# Altium footprint library PowerProducts.PCBLIB: 166 footprints (part 3 of 11)
Each footprint in its own frame and in the unit in brackets; x right, y up, seen from the top. Pads: shape width x height; smd on the part's side, far side on the other; paste and mask are expansions set on the pad; w line width, h text height; cw(c..) or ccw(c..) is an arc to the next point about the centre after c.
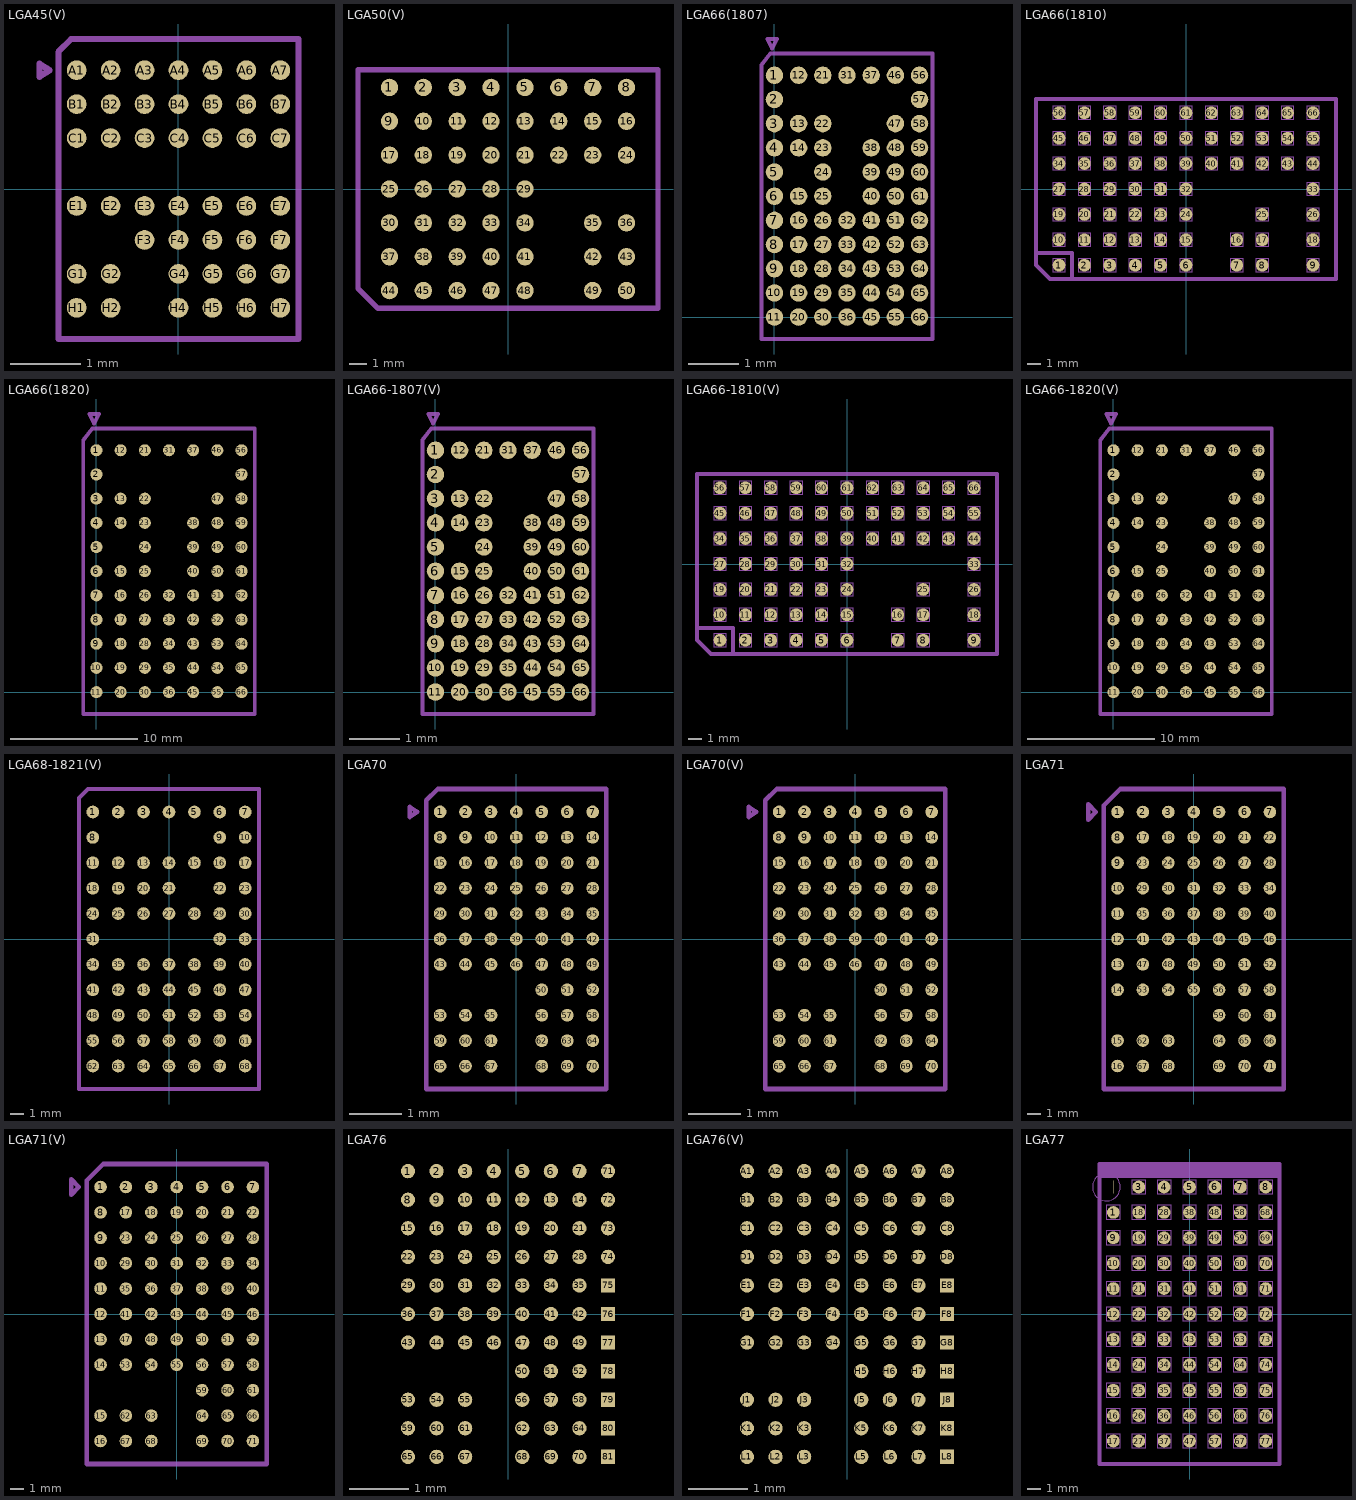
[diagram p2: the footprints below, top view; thin cyan lines are the x and y axes]

## LGA45(V) [mil]
pads (45):
  rrect100% 11.05x11.05 smd: A1(-57.15,66.68) A2(-38.1,66.68) A3(-19.05,66.68) A4(0,66.68) A5(19.05,66.68) A6(38.1,66.68) A7(57.15,66.68) B1(-57.15,47.63) B2(-38.1,47.63) B3(-19.05,47.63) B4(0,47.63) B5(19.05,47.63) B6(38.1,47.63) B7(57.15,47.63) C1(-57.15,28.58) C2(-38.1,28.58) C3(-19.05,28.58) C4(0,28.58) C5(19.05,28.58) C6(38.1,28.58) C7(57.15,28.58) E1(-57.15,-9.53) E2(-38.1,-9.53) E3(-19.05,-9.53) E4(0,-9.53) E5(19.05,-9.53) E6(38.1,-9.53) E7(57.15,-9.53) F3(-19.05,-28.58) F4(0,-28.58) F5(19.05,-28.58) F6(38.1,-28.58) F7(57.15,-28.58) G1(-57.15,-47.63) G2(-38.1,-47.63) G4(0,-47.63) G5(19.05,-47.63) G6(38.1,-47.63) G7(57.15,-47.63) H1(-57.15,-66.68) H2(-38.1,-66.68) H4(0,-66.68) H5(19.05,-66.68) H6(38.1,-66.68) H7(57.15,-66.68)
Mechanical 2:
  lines w3.43: -78.1,62.87 -72.39,66.68 -78.1,70.49 -78.1,62.87 ; -67.44,-84.2 67.44,-84.2 67.44,84.2 -60.2,84.2 -67.44,76.96 -67.44,-84.2

## LGA50(V) [mil]
pads (50):
  rrect100% 38.39x38.39 smd: 1(-262.5,225) 2(-187.5,225) 3(-112.5,225) 4(-37.5,225) 5(37.5,225) 6(112.5,225) 7(187.5,225) 8(262.5,225) 9(-262.5,150) 10(-187.5,150) 11(-112.5,150) 12(-37.5,150) 13(37.5,150) 14(112.5,150) 15(187.5,150) 16(262.5,150) 17(-262.5,75) 18(-187.5,75) 19(-112.5,75) 20(-37.5,75) 21(37.5,75) 22(112.5,75) 23(187.5,75) 24(262.5,75) 25(-262.5,0) 26(-187.5,0) 27(-112.5,0) 28(-37.5,0) 29(37.5,0) 30(-262.5,-75) 31(-187.5,-75) 32(-112.5,-75) 33(-37.5,-75) 34(37.5,-75) 35(187.5,-75) 36(262.5,-75) 37(-262.5,-150) 38(-187.5,-150) 39(-112.5,-150) 40(-37.5,-150) 41(37.5,-150) 42(187.5,-150) 43(262.5,-150) 44(-262.5,-225) 45(-187.5,-225) 46(-112.5,-225) 47(-37.5,-225) 48(37.5,-225) 49(187.5,-225) 50(262.5,-225)
Mechanical 2:
  lines w11.81: -332.19,-219.98 -287.89,-264.27 332.19,-264.27 332.19,264.27 -332.19,264.27 -332.19,-219.98

## LGA66(1807) [mil]
pads (66):
  rrect100% 13.72x13.72 smd: 1(0,190.5) 2(0,171.45) 3(0,152.4) 4(0,133.35) 5(0,114.3) 6(0,95.25) 7(0,76.2) 8(0,57.15) 9(0,38.1) 10(0,19.05) 11(0,0) 12(19.05,190.5) 13(19.05,152.4) 14(19.05,133.35) 15(19.05,95.25) 16(19.05,76.2) 17(19.05,57.15) 18(19.05,38.1) 19(19.05,19.05) 20(19.05,0) 21(38.1,190.5) 22(38.1,152.4) 23(38.1,133.35) 24(38.1,114.3) 25(38.1,95.25) 26(38.1,76.2) 27(38.1,57.15) 28(38.1,38.1) 29(38.1,19.05) 30(38.1,0) 31(57.15,190.5) 32(57.15,76.2) 33(57.15,57.15) 34(57.15,38.1) 35(57.15,19.05) 36(57.15,0) 37(76.2,190.5) 38(76.2,133.35) 39(76.2,114.3) 40(76.2,95.25) 41(76.2,76.2) 42(76.2,57.15) 43(76.2,38.1) 44(76.2,19.05) 45(76.2,0) 46(95.25,190.5) 47(95.25,152.4) 48(95.25,133.35) 49(95.25,114.3) 50(95.25,95.25) 51(95.25,76.2) 52(95.25,57.15) 53(95.25,38.1) 54(95.25,19.05) 55(95.25,0) 56(114.3,190.5) 57(114.3,171.45) 58(114.3,152.4) 59(114.3,133.35) 60(114.3,114.3) 61(114.3,95.25) 62(114.3,76.2) 63(114.3,57.15) 64(114.3,38.1) 65(114.3,19.05) 66(114.3,0)
Mechanical 2:
  lines w3.05: -10.35,-17.25 -10.35,198.5 -2.98,207.75 124.65,207.75 124.65,-17.25 -10.35,-17.25 ; -5.72,219.08 1.91,219.08 -1.91,211.46 -5.72,219.08

## LGA66(1810) [mil]
pads (66):
  rrect100% 37.5x37.5 smd: 1(-375,-225) 2(-300,-225) 3(-225,-225) 4(-150,-225) 5(-75,-225) 6(0,-225) 7(150,-225) 8(225,-225) 9(375,-225) 10(-375,-150) 11(-300,-150) 12(-225,-150) 13(-150,-150) 14(-75,-150) 15(0,-150) 16(150,-150) 17(225,-150) 18(375,-150) 19(-375,-75) 20(-300,-75) 21(-225,-75) 22(-150,-75) 23(-75,-75) 24(0,-75) 25(225,-75) 26(375,-75) 27(-375,0) 28(-300,0) 29(-225,0) 30(-150,0) 31(-75,0) 32(0,0) 33(375,0) 34(-375,75) 35(-300,75) 36(-225,75) 37(-150,75) 38(-75,75) 39(0,75) 40(75,75) 41(150,75) 42(225,75) 43(300,75) 44(375,75) 45(-375,150) 46(-300,150) 47(-225,150) 48(-150,150) 49(-75,150) 50(0,150) 51(75,150) 52(150,150) 53(225,150) 54(300,150) 55(375,150) 56(-375,225) 57(-300,225) 58(-225,225) 59(-150,225) 60(-75,225) 61(0,225) 62(75,225) 63(150,225) 64(225,225) 65(300,225) 66(375,225)
Mechanical 2:
  drawing of 271 lines, arcs and shapes, not listed

## LGA66(1820) [mil]
pads (66):
  rrect100% 37.2x37.2 smd: 1(0,750) 2(0,675) 3(0,600) 4(0,525) 5(0,450) 6(0,375) 7(0,300) 8(0,225) 9(0,150) 10(0,75) 11(0,0) 12(75,750) 13(75,600) 14(75,525) 15(75,375) 16(75,300) 17(75,225) 18(75,150) 19(75,75) 20(75,0) 21(150,750) 22(150,600) 23(150,525) 24(150,450) 25(150,375) 26(150,300) 27(150,225) 28(150,150) 29(150,75) 30(150,0) 31(225,750) 32(225,300) 33(225,225) 34(225,150) 35(225,75) 36(225,0) 37(300,750) 38(300,525) 39(300,450) 40(300,375) 41(300,300) 42(300,225) 43(300,150) 44(300,75) 45(300,0) 46(375,750) 47(375,600) 48(375,525) 49(375,450) 50(375,375) 51(375,300) 52(375,225) 53(375,150) 54(375,75) 55(375,0) 56(450,750) 57(450,675) 58(450,600) 59(450,525) 60(450,450) 61(450,375) 62(450,300) 63(450,225) 64(450,150) 65(450,75) 66(450,0)
Mechanical 2:
  lines w12: -40.75,-67.91 -40.75,781.5 -11.75,817.91 490.75,817.91 490.75,-67.91 -40.75,-67.91 ; -22.5,862.5 7.5,862.5 -7.5,832.5 -22.5,862.5

## LGA66-1807(V) [mil]
pads (66):
  rrect100% 13.72x13.72 smd: 1(0,190.5) 2(0,171.45) 3(0,152.4) 4(0,133.35) 5(0,114.3) 6(0,95.25) 7(0,76.2) 8(0,57.15) 9(0,38.1) 10(0,19.05) 11(0,0) 12(19.05,190.5) 13(19.05,152.4) 14(19.05,133.35) 15(19.05,95.25) 16(19.05,76.2) 17(19.05,57.15) 18(19.05,38.1) 19(19.05,19.05) 20(19.05,0) 21(38.1,190.5) 22(38.1,152.4) 23(38.1,133.35) 24(38.1,114.3) 25(38.1,95.25) 26(38.1,76.2) 27(38.1,57.15) 28(38.1,38.1) 29(38.1,19.05) 30(38.1,0) 31(57.15,190.5) 32(57.15,76.2) 33(57.15,57.15) 34(57.15,38.1) 35(57.15,19.05) 36(57.15,0) 37(76.2,190.5) 38(76.2,133.35) 39(76.2,114.3) 40(76.2,95.25) 41(76.2,76.2) 42(76.2,57.15) 43(76.2,38.1) 44(76.2,19.05) 45(76.2,0) 46(95.25,190.5) 47(95.25,152.4) 48(95.25,133.35) 49(95.25,114.3) 50(95.25,95.25) 51(95.25,76.2) 52(95.25,57.15) 53(95.25,38.1) 54(95.25,19.05) 55(95.25,0) 56(114.3,190.5) 57(114.3,171.45) 58(114.3,152.4) 59(114.3,133.35) 60(114.3,114.3) 61(114.3,95.25) 62(114.3,76.2) 63(114.3,57.15) 64(114.3,38.1) 65(114.3,19.05) 66(114.3,0)
Mechanical 2:
  lines w3.05: -10.35,-17.25 -10.35,198.5 -2.98,207.75 124.65,207.75 124.65,-17.25 -10.35,-17.25 ; -5.72,219.08 1.91,219.08 -1.91,211.46 -5.72,219.08

## LGA66-1810(V) [mil]
pads (66):
  rrect100% 37.5x37.5 smd: 1(-375,-225) 2(-300,-225) 3(-225,-225) 4(-150,-225) 5(-75,-225) 6(0,-225) 7(150,-225) 8(225,-225) 9(375,-225) 10(-375,-150) 11(-300,-150) 12(-225,-150) 13(-150,-150) 14(-75,-150) 15(0,-150) 16(150,-150) 17(225,-150) 18(375,-150) 19(-375,-75) 20(-300,-75) 21(-225,-75) 22(-150,-75) 23(-75,-75) 24(0,-75) 25(225,-75) 26(375,-75) 27(-375,0) 28(-300,0) 29(-225,0) 30(-150,0) 31(-75,0) 32(0,0) 33(375,0) 34(-375,75) 35(-300,75) 36(-225,75) 37(-150,75) 38(-75,75) 39(0,75) 40(75,75) 41(150,75) 42(225,75) 43(300,75) 44(375,75) 45(-375,150) 46(-300,150) 47(-225,150) 48(-150,150) 49(-75,150) 50(0,150) 51(75,150) 52(150,150) 53(225,150) 54(300,150) 55(375,150) 56(-375,225) 57(-300,225) 58(-225,225) 59(-150,225) 60(-75,225) 61(0,225) 62(75,225) 63(150,225) 64(225,225) 65(300,225) 66(375,225)
Mechanical 2:
  drawing of 273 lines, arcs and shapes, not listed

## LGA66-1820(V) [mil]
pads (66):
  rrect100% 37.2x37.2 smd: 1(0,750) 2(0,675) 3(0,600) 4(0,525) 5(0,450) 6(0,375) 7(0,300) 8(0,225) 9(0,150) 10(0,75) 11(0,0) 12(75,750) 13(75,600) 14(75,525) 15(75,375) 16(75,300) 17(75,225) 18(75,150) 19(75,75) 20(75,0) 21(150,750) 22(150,600) 23(150,525) 24(150,450) 25(150,375) 26(150,300) 27(150,225) 28(150,150) 29(150,75) 30(150,0) 31(225,750) 32(225,300) 33(225,225) 34(225,150) 35(225,75) 36(225,0) 37(300,750) 38(300,525) 39(300,450) 40(300,375) 41(300,300) 42(300,225) 43(300,150) 44(300,75) 45(300,0) 46(375,750) 47(375,600) 48(375,525) 49(375,450) 50(375,375) 51(375,300) 52(375,225) 53(375,150) 54(375,75) 55(375,0) 56(450,750) 57(450,675) 58(450,600) 59(450,525) 60(450,450) 61(450,375) 62(450,300) 63(450,225) 64(450,150) 65(450,75) 66(450,0)
Mechanical 2:
  lines w12: -40.75,-67.91 -40.75,781.5 -11.75,817.91 490.75,817.91 490.75,-67.91 -40.75,-67.91 ; -22.5,862.5 7.5,862.5 -7.5,832.5 -22.5,862.5

## LGA68-1821(V) [mil]
pads (68):
  rrect100% 37.5x37.5 smd: 1(-225,375) 2(-150,375) 3(-75,375) 4(0,375) 5(75,375) 6(150,375) 7(225,375) 8(-225,300) 9(150,300) 10(225,300) 11(-225,225) 12(-150,225) 13(-75,225) 14(0,225) 15(75,225) 16(150,225) 17(225,225) 18(-225,150) 19(-150,150) 20(-75,150) 21(0,150) 22(150,150) 23(225,150) 24(-225,75) 25(-150,75) 26(-75,75) 27(0,75) 28(75,75) 29(150,75) 30(225,75) 31(-225,0) 32(150,0) 33(225,0) 34(-225,-75) 35(-150,-75) 36(-75,-75) 37(0,-75) 38(75,-75) 39(150,-75) 40(225,-75) 41(-225,-150) 42(-150,-150) 43(-75,-150) 44(0,-150) 45(75,-150) 46(150,-150) 47(225,-150) 48(-225,-225) 49(-150,-225) 50(-75,-225) 51(0,-225) 52(75,-225) 53(150,-225) 54(225,-225) 55(-225,-300) 56(-150,-300) 57(-75,-300) 58(0,-300) 59(75,-300) 60(150,-300) 61(225,-300) 62(-225,-375) 63(-150,-375) 64(-75,-375) 65(0,-375) 66(75,-375) 67(150,-375) 68(225,-375)
Mechanical 2:
  lines w11.81: -265.75,-442.91 -265.75,416.66 -239.5,442.91 265.75,442.91 265.75,-442.91 -265.75,-442.91

## LGA70 [mil]
pads (70):
  rrect100% 9.53x9.53 smd: 1(-57.15,95.25) 2(-38.1,95.25) 3(-19.05,95.25) 4(0,95.25) 5(19.05,95.25) 6(38.1,95.25) 7(57.15,95.25) 8(-57.15,76.2) 9(-38.1,76.2) 10(-19.05,76.2) 11(0,76.2) 12(19.05,76.2) 13(38.1,76.2) 14(57.15,76.2) 15(-57.15,57.15) 16(-38.1,57.15) 17(-19.05,57.15) 18(0,57.15) 19(19.05,57.15) 20(38.1,57.15) 21(57.15,57.15) 22(-57.15,38.1) 23(-38.1,38.1) 24(-19.05,38.1) 25(0,38.1) 26(19.05,38.1) 27(38.1,38.1) 28(57.15,38.1) 29(-57.15,19.05) 30(-38.1,19.05) 31(-19.05,19.05) 32(0,19.05) 33(19.05,19.05) 34(38.1,19.05) 35(57.15,19.05) 36(-57.15,0) 37(-38.1,0) 38(-19.05,0) 39(0,0) 40(19.05,0) 41(38.1,0) 42(57.15,0) 43(-57.15,-19.05) 44(-38.1,-19.05) 45(-19.05,-19.05) 46(0,-19.05) 47(19.05,-19.05) 48(38.1,-19.05) 49(57.15,-19.05) 50(19.05,-38.1) 51(38.1,-38.1) 52(57.15,-38.1) 53(-57.15,-57.15) 54(-38.1,-57.15) 55(-19.05,-57.15) 56(19.05,-57.15) 57(38.1,-57.15) 58(57.15,-57.15) 59(-57.15,-76.2) 60(-38.1,-76.2) 61(-19.05,-76.2) 62(19.05,-76.2) 63(38.1,-76.2) 64(57.15,-76.2) 65(-57.15,-95.25) 66(-38.1,-95.25) 67(-19.05,-95.25) 68(19.05,-95.25) 69(38.1,-95.25) 70(57.15,-95.25)
Mechanical 2:
  lines w3.43: -80.01,91.44 -74.3,95.25 -80.01,99.06 -80.01,91.44 ; -67.44,-112.4 67.44,-112.4 67.44,112.4 -59.06,112.4 -67.44,104.01 -67.44,-112.4

## LGA70(V) [mil]
pads (70):
  rrect100% 9.53x9.53 smd: 1(-57.15,95.25) 2(-38.1,95.25) 3(-19.05,95.25) 4(0,95.25) 5(19.05,95.25) 6(38.1,95.25) 7(57.15,95.25) 8(-57.15,76.2) 9(-38.1,76.2) 10(-19.05,76.2) 11(0,76.2) 12(19.05,76.2) 13(38.1,76.2) 14(57.15,76.2) 15(-57.15,57.15) 16(-38.1,57.15) 17(-19.05,57.15) 18(0,57.15) 19(19.05,57.15) 20(38.1,57.15) 21(57.15,57.15) 22(-57.15,38.1) 23(-38.1,38.1) 24(-19.05,38.1) 25(0,38.1) 26(19.05,38.1) 27(38.1,38.1) 28(57.15,38.1) 29(-57.15,19.05) 30(-38.1,19.05) 31(-19.05,19.05) 32(0,19.05) 33(19.05,19.05) 34(38.1,19.05) 35(57.15,19.05) 36(-57.15,0) 37(-38.1,0) 38(-19.05,0) 39(0,0) 40(19.05,0) 41(38.1,0) 42(57.15,0) 43(-57.15,-19.05) 44(-38.1,-19.05) 45(-19.05,-19.05) 46(0,-19.05) 47(19.05,-19.05) 48(38.1,-19.05) 49(57.15,-19.05) 50(19.05,-38.1) 51(38.1,-38.1) 52(57.15,-38.1) 53(-57.15,-57.15) 54(-38.1,-57.15) 55(-19.05,-57.15) 56(19.05,-57.15) 57(38.1,-57.15) 58(57.15,-57.15) 59(-57.15,-76.2) 60(-38.1,-76.2) 61(-19.05,-76.2) 62(19.05,-76.2) 63(38.1,-76.2) 64(57.15,-76.2) 65(-57.15,-95.25) 66(-38.1,-95.25) 67(-19.05,-95.25) 68(19.05,-95.25) 69(38.1,-95.25) 70(57.15,-95.25)
Mechanical 2:
  lines w3.43: -80.01,91.44 -74.3,95.25 -80.01,99.06 -80.01,91.44 ; -67.44,-112.4 67.44,-112.4 67.44,112.4 -59.06,112.4 -67.44,104.01 -67.44,-112.4

## LGA71 [mil]
pads (71):
  rrect100% 37.2x37.2 smd: 1(-225,375) 2(-150,375) 3(-75,375) 4(0,375) 5(75,375) 6(150,375) 7(225,375) 8(-225,300) 9(-225,225) 10(-225,150) 11(-225,75) 12(-225,0) 13(-225,-75) 14(-225,-150) 15(-225,-300) 16(-225,-375) 17(-150,300) 18(-75,300) 19(0,300) 20(75,300) 21(150,300) 22(225,300) 23(-150,225) 24(-75,225) 25(0,225) 26(75,225) 27(150,225) 28(225,225) 29(-150,150) 30(-75,150) 31(0,150) 32(75,150) 33(150,150) 34(225,150) 35(-150,75) 36(-75,75) 37(0,75) 38(75,75) 39(150,75) 40(225,75) 41(-150,0) 42(-75,0) 43(0,0) 44(75,0) 45(150,0) 46(225,0) 47(-150,-75) 48(-75,-75) 49(0,-75) 50(75,-75) 51(150,-75) 52(225,-75) 53(-150,-150) 54(-75,-150) 55(0,-150) 56(75,-150) 57(150,-150) 58(225,-150) 59(75,-225) 60(150,-225) 61(225,-225) 62(-150,-300) 63(-75,-300) 64(75,-300) 65(150,-300) 66(225,-300) 67(-150,-375) 68(-75,-375) 69(75,-375) 70(150,-375) 71(225,-375)
Mechanical 2:
  lines w13.5: -311.25,352.5 -311.25,375 -311.25,397.5 -288.75,375 -311.25,352.5 ; -265.75,-442.91 265.75,-442.91 265.75,442.91 -217.09,442.91 -265.75,394.25 -265.75,-442.91

## LGA71(V) [mil]
pads (71):
  rrect100% 37.2x37.2 smd: 1(-225,375) 2(-150,375) 3(-75,375) 4(0,375) 5(75,375) 6(150,375) 7(225,375) 8(-225,300) 9(-225,225) 10(-225,150) 11(-225,75) 12(-225,0) 13(-225,-75) 14(-225,-150) 15(-225,-300) 16(-225,-375) 17(-150,300) 18(-75,300) 19(0,300) 20(75,300) 21(150,300) 22(225,300) 23(-150,225) 24(-75,225) 25(0,225) 26(75,225) 27(150,225) 28(225,225) 29(-150,150) 30(-75,150) 31(0,150) 32(75,150) 33(150,150) 34(225,150) 35(-150,75) 36(-75,75) 37(0,75) 38(75,75) 39(150,75) 40(225,75) 41(-150,0) 42(-75,0) 43(0,0) 44(75,0) 45(150,0) 46(225,0) 47(-150,-75) 48(-75,-75) 49(0,-75) 50(75,-75) 51(150,-75) 52(225,-75) 53(-150,-150) 54(-75,-150) 55(0,-150) 56(75,-150) 57(150,-150) 58(225,-150) 59(75,-225) 60(150,-225) 61(225,-225) 62(-150,-300) 63(-75,-300) 64(75,-300) 65(150,-300) 66(225,-300) 67(-150,-375) 68(-75,-375) 69(75,-375) 70(150,-375) 71(225,-375)
Mechanical 2:
  lines w13.5: -311.25,352.5 -288.75,375 -311.25,397.5 -311.25,352.5 ; -265.75,-442.91 265.75,-442.91 265.75,442.91 -217.09,442.91 -265.75,394.25 -265.75,-442.91

## LGA76 [mil]
pads (81):
  rrect100% 9.53x9.53 smd: 1(-66.68,95.25) 2(-47.63,95.25) 3(-28.58,95.25) 4(-9.53,95.25) 5(9.53,95.25) 6(28.58,95.25) 7(47.63,95.25) 8(-66.68,76.2) 9(-47.63,76.2) 10(-28.58,76.2) 11(-9.53,76.2) 12(9.53,76.2) 13(28.58,76.2) 14(47.63,76.2) 15(-66.68,57.15) 16(-47.63,57.15) 17(-28.58,57.15) 18(-9.53,57.15) 19(9.53,57.15) 20(28.58,57.15) 21(47.63,57.15) 22(-66.68,38.1) 23(-47.63,38.1) 24(-28.58,38.1) 25(-9.53,38.1) 26(9.53,38.1) 27(28.58,38.1) 28(47.63,38.1) 29(-66.68,19.05) 30(-47.63,19.05) 31(-28.58,19.05) 32(-9.53,19.05) 33(9.53,19.05) 34(28.58,19.05) 35(47.63,19.05) 36(-66.68,0) 37(-47.63,0) 38(-28.58,0) 39(-9.53,0) 40(9.53,0) 41(28.58,0) 42(47.63,0) 43(-66.68,-19.05) 44(-47.63,-19.05) 45(-28.58,-19.05) 46(-9.53,-19.05) 47(9.53,-19.05) 48(28.58,-19.05) 49(47.63,-19.05) 50(9.53,-38.1) 51(28.58,-38.1) 52(47.63,-38.1) 53(-66.68,-57.15) 54(-47.63,-57.15) 55(-28.58,-57.15) 56(9.53,-57.15) 57(28.58,-57.15) 58(47.63,-57.15) 59(-66.68,-76.2) 60(-47.63,-76.2) 61(-28.58,-76.2) 62(9.53,-76.2) 63(28.58,-76.2) 64(47.63,-76.2) 65(-66.68,-95.25) 66(-47.63,-95.25) 67(-28.58,-95.25) 68(9.53,-95.25) 69(28.58,-95.25) 70(47.63,-95.25) 71(66.68,95.25) 72(66.68,76.2) 73(66.68,57.15) 74(66.68,38.1)
  rect 9.53x9.53 smd: 75(66.68,19.05) 76(66.68,0) 77(66.68,-19.05) 78(66.68,-38.1) 79(66.68,-57.15) 80(66.68,-76.2) 81(66.68,-95.25)

## LGA76(V) [mil]
pads (81):
  rrect100% 9.53x9.53 smd: A1(-66.68,95.25) A2(-47.63,95.25) A3(-28.58,95.25) A4(-9.53,95.25) A5(9.53,95.25) A6(28.58,95.25) A7(47.63,95.25) A8(66.68,95.25) B1(-66.68,76.2) B2(-47.63,76.2) B3(-28.58,76.2) B4(-9.53,76.2) B5(9.53,76.2) B6(28.58,76.2) B7(47.63,76.2) B8(66.68,76.2) C1(-66.68,57.15) C2(-47.63,57.15) C3(-28.58,57.15) C4(-9.53,57.15) C5(9.53,57.15) C6(28.58,57.15) C7(47.63,57.15) C8(66.68,57.15) D1(-66.68,38.1) D2(-47.63,38.1) D3(-28.58,38.1) D4(-9.53,38.1) D5(9.53,38.1) D6(28.58,38.1) D7(47.63,38.1) D8(66.68,38.1) E1(-66.68,19.05) E2(-47.63,19.05) E3(-28.58,19.05) E4(-9.53,19.05) E5(9.53,19.05) E6(28.58,19.05) E7(47.63,19.05) F1(-66.68,0) F2(-47.63,0) F3(-28.58,0) F4(-9.53,0) F5(9.53,0) F6(28.58,0) F7(47.63,0) G1(-66.68,-19.05) G2(-47.63,-19.05) G3(-28.58,-19.05) G4(-9.53,-19.05) G5(9.53,-19.05) G6(28.58,-19.05) G7(47.63,-19.05) H5(9.53,-38.1) H6(28.58,-38.1) H7(47.63,-38.1) J1(-66.68,-57.15) J2(-47.63,-57.15) J3(-28.58,-57.15) J5(9.53,-57.15) J6(28.58,-57.15) J7(47.63,-57.15) K1(-66.68,-76.2) K2(-47.63,-76.2) K3(-28.58,-76.2) K5(9.53,-76.2) K6(28.58,-76.2) K7(47.63,-76.2) L1(-66.68,-95.25) L2(-47.63,-95.25) L3(-28.58,-95.25) L5(9.53,-95.25) L6(28.58,-95.25) L7(47.63,-95.25)
  rect 9.53x9.53 smd: E8(66.68,19.05) F8(66.68,0) G8(66.68,-19.05) H8(66.68,-38.1) J8(66.68,-57.15) K8(66.68,-76.2) L8(66.68,-95.25)

## LGA77 [mil]
pads (77):
  rrect100% 37.5x37.5 smd: 1(-225,300) 3(-150,375) 4(-75,375) 5(0,375) 6(75,375) 7(150,375) 8(225,375) 9(-225,225) 10(-225,150) 11(-225,75) 12(-225,0) 13(-225,-75) 14(-225,-150) 15(-225,-225) 16(-225,-300) 17(-225,-375) 18(-150,300) 19(-150,225) 20(-150,150) 21(-150,75) 22(-150,0) 23(-150,-75) 24(-150,-150) 25(-150,-225) 26(-150,-300) 27(-150,-375) 28(-75,300) 29(-75,225) 30(-75,150) 31(-75,75) 32(-75,0) 33(-75,-75) 34(-75,-150) 35(-75,-225) 36(-75,-300) 37(-75,-375) 38(0,300) 39(0,225) 40(0,150) 41(0,75) 42(0,0) 43(0,-75) 44(0,-150) 45(0,-225) 46(0,-300) 47(0,-375) 48(75,300) 49(75,225) 50(75,150) 51(75,75) 52(75,0) 53(75,-75) 54(75,-150) 55(75,-225) 56(75,-300) 57(75,-375) 58(150,300) 59(150,225) 60(150,150) 61(150,75) 62(150,0) 63(150,-75) 64(150,-150) 65(150,-225) 66(150,-300) 67(150,-375) 68(225,300) 69(225,225) 70(225,150) 71(225,75) 72(225,0) 73(225,-75) 74(225,-150) 75(225,-225) 76(225,-300) 77(225,-375)
  rrect100% 0x37.5 smd: 2(-225,375)
Mechanical 2:
  drawing of 618 lines, arcs and shapes, not listed